# Altium footprint library SparkFun.PCBLIB: 674 footprints (part 36 of 44)
Each footprint in its own frame and in the unit in brackets; x right, y up, seen from the top. Pads: shape width x height; smd on the part's side, far side on the other; paste and mask are expansions set on the pad; w line width, h text height; cw(c..) or ccw(c..) is an arc to the next point about the centre after c.
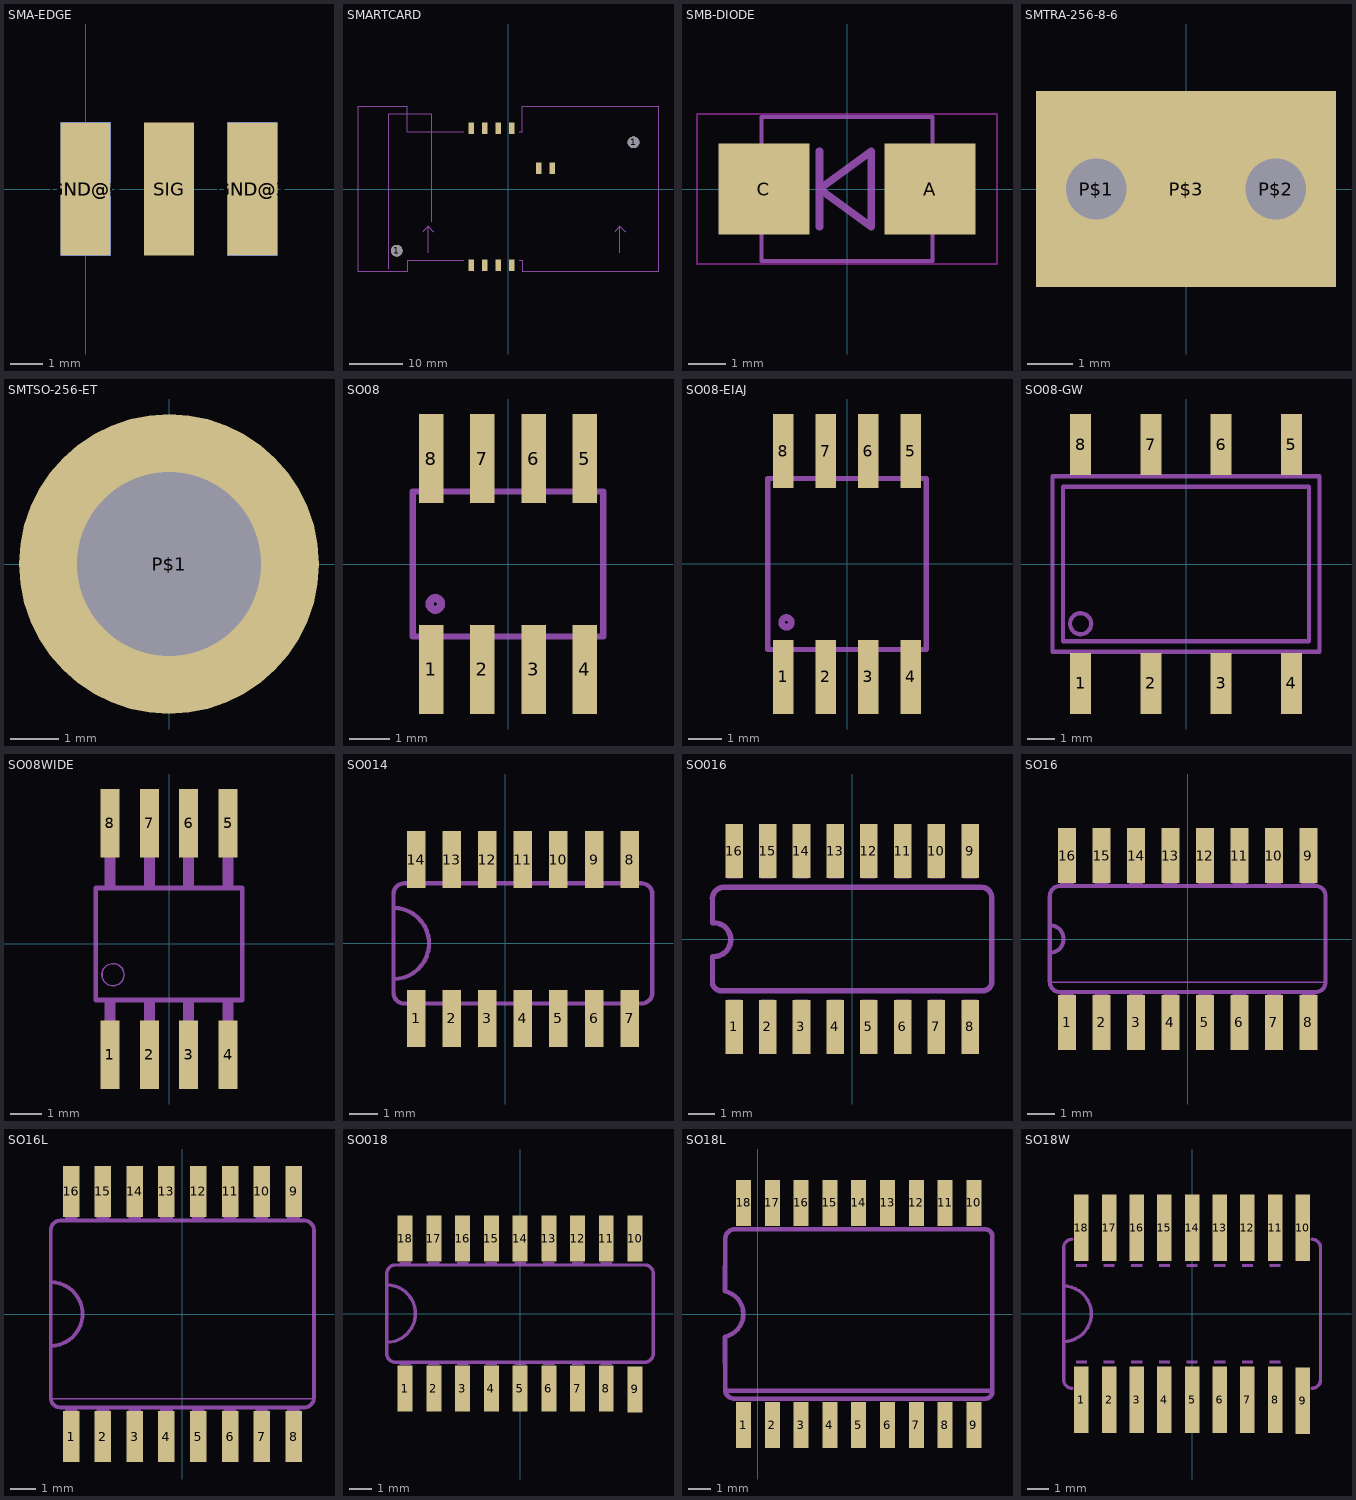
[diagram p35: the footprints below, top view; thin cyan lines are the x and y axes]

## SMA-EDGE [mil]
pads (5):
  rect 60x160 smd paste-80: GND@0(0,0) GND@1(200,0) SIG(100,0)
  rect 60x160 smd far side: GND@2(0,0) GND@3(200,0)

## SMARTCARD [mm]
pads (12):
  round 2.2 hole 2.2: 1(-20.89,-11.57) 1(23.56,8.75)
  rect 1x2.1 smd: C1(-6.92,11.4) C2(-4.38,11.4) C3(-1.84,11.4) C4(0.7,11.4) C5(-6.92,-14.3) C6(-4.38,-14.3) C7(-1.84,-14.3) C8(0.7,-14.3) P1(5.78,3.91) P2(8.32,3.91)
Mechanical 2:
  lines w0.203: -8.29,-13.35 -18.89,-13.35 -18.89,-15.55 -28.15,-15.55 -28.15,15.55 -18.89,15.55 -18.89,10.7 -8.29,10.7 ; 2.11,-13.35 2.71,-13.35 2.71,-15.55 28.15,-15.55 28.15,15.55 2.71,15.55 2.71,10.7 2.11,10.7
Mechanical 18:
  lines w0.127: -22.5,-15 -22.5,14 -14.3,14 -14.3,-6.11
  lines w0.203: -16,-8 -15,-7 ; -15,-12 -15,-7 ; -14,-8 -15,-7 ; 20,-8 21,-7 ; 21,-12 21,-7 ; 22,-8 21,-7

## SMB-DIODE [mil]
pads (2):
  rect 94.49x94.49 smd: A(86.61,0) C(-86.61,0)
Keep-Out Layer:
  lines w2: -156.42,-78.07 156.42,-78.07 156.42,78.07 -156.42,78.07 -156.42,-78.07
Mechanical 2:
  lines w4: -89,-75 89,-75 ; -89,75 89,75
  lines w8: -28.74,-39.37 -28.74,39.37 ; -28.74,0 25.32,39.37 25.32,-39.37 -28.74,0
Mechanical 18:
  rectangle: -110,-43 -89,43
  rectangle: 89,-43 110,43
  lines w4: -89.02,-75 -89.02,75 ; 89.02,-75 89.02,75

## SMTRA-256-8-6 [mil]
pads (3):
  round 79.5 hole 53: P$1(-78.5,0) P$2(78.5,0)
  rect 262x171 smd paste-131: P$3(0,0)
Top Paste:
  rectangle: -130,30 130,80
  rectangle: -40,20 40,30
  rectangle: -40,-40 40,-30
  rectangle: -130,-80 130,-30
  rectangle: -40,-30 40,-20
  rectangle: 110,20 130,30
  rectangle: 110,-30 130,-20
  rectangle: -130,-30 -110,-20
  rectangle: -130,20 -110,30

## SMTSO-256-ET [mil]
pads (1):
  round 244 hole 150: P$1(0,0)
Top Paste:
  lines w40: -90,-40 ccw(c0,0) -40,-90 ; -90,40 cw(c0,0) -40,90 ; 40,-90 ccw(c0,0) 90,-40 ; 40,90 cw(c0,0) 90,40
Mechanical 18:
  circle w5: c0,0 r40

## SO08 [mil]
pads (8):
  rect 24x87 smd: 1(-75,-103) 2(-25,-103) 3(25,-103) 4(75,-103) 5(75,103) 6(25,103) 7(-25,103) 8(-75,103)
Mechanical 2:
  circle w8: c-71,-39 r5.65
  lines w6: -92.99,-70.98 -92.99,70.98 ; 92.99,-70.98 92.99,70.98
Mechanical 18:
  rectangle: -82,-113 -68,-73
  rectangle: -32,-113 -18,-73
  rectangle: 18,-113 32,-73
  rectangle: 68,-113 82,-73
  rectangle: -82,73 -68,113
  rectangle: -32,73 -18,113
  rectangle: 18,73 32,113
  rectangle: 68,73 82,113
  lines w6: -92.99,-70.98 92.99,-70.98 ; -92.99,70.98 92.99,70.98

## SO08-EIAJ [mil]
pads (8):
  rect 24x87 smd: 1(-75,-133) 2(-25,-133) 3(25,-133) 4(75,-133) 5(75,132) 6(25,132) 7(-25,132) 8(-75,132)
Mechanical 2:
  circle w8: c-71,-69 r5.65
  lines w6: -92.99,-100.98 -92.99,99.98 ; 92.99,-100.98 92.99,99.98
Mechanical 18:
  rectangle: -82,-143 -68,-103
  rectangle: -32,-143 -18,-103
  rectangle: 18,-143 32,-103
  rectangle: 68,-143 82,-103
  rectangle: -82,102 -68,142
  rectangle: -32,102 -18,142
  rectangle: 18,102 32,142
  rectangle: 68,102 82,142
  lines w6: -92.99,-100.98 92.99,-100.98 ; -92.99,99.98 92.99,99.98

## SO08-GW [mil]
pads (8):
  rect 30x87 smd: 1(-150,-170) 2(-50,-170) 3(50,-170) 4(150,-170) 5(150,170) 6(50,170) 7(-50,170) 8(-150,170)
Mechanical 2:
  circle w6: c-150,-85 r15
  lines w6: -170,-125 -190,-125 -190,125 -170,125 ; -130,-125 -70,-125 ; -130,125 -70,125 ; -30,-125 30,-125 ; -30,125 30,125 ; 70,-125 130,-125 ; 70,125 130,125 ; 170,-125 190,-125 190,125 170,125 ; -175,-110 175,-110 175,110 -175,110 -175,-110
Mechanical 18:
  rectangle: -160,-190 -140,-125
  rectangle: -60,-190 -40,-125
  rectangle: 40,-190 60,-125
  rectangle: 140,-190 160,-125
  rectangle: -160,125 -140,190
  rectangle: -60,125 -40,190
  rectangle: 40,125 60,190
  rectangle: 140,125 160,190
  lines w6: -170,-125 -130,-125 ; -170,125 -130,125 ; -70,-125 -30,-125 ; -70,125 -30,125 ; 30,-125 70,-125 ; 30,125 70,125 ; 130,-125 170,-125 ; 130,125 170,125

## SO08WIDE [mil]
pads (8):
  rect 24x87 smd: 1(-75,-140.5) 2(-25,-140.5) 3(25,-140.5) 4(75,-140.5) 5(75,153) 6(25,153) 7(-25,153) 8(-75,153)
Mechanical 2:
  circle w2: c-71,-39 r14
  lines w6: -92.99,-70.98 -92.99,70.98 ; 92.99,-70.98 92.99,70.98
Mechanical 18:
  rectangle: -82,-113 -68,-73
  rectangle: -32,-113 -18,-73
  rectangle: 18,-113 32,-73
  rectangle: 68,-113 82,-73
  rectangle: -82,73 -68,113
  rectangle: -32,73 -18,113
  rectangle: 18,73 32,113
  rectangle: 68,73 82,113
  lines w6: -92.99,-70.98 92.99,-70.98 ; -92.99,70.98 92.99,70.98

## SO014 [mil]
pads (14):
  rect 26x80 smd: 1(-125,-105.5) 2(-75,-105.5) 3(-25,-105.5) 4(25,-105.5) 5(75,-105.5) 6(125,-105.5) 7(175,-105.5) 8(175,118) 9(125,118) 10(75,118) 11(25,118) 12(-25,118) 13(-75,118) 14(-125,118)
Mechanical 2:
  rectangle: -135,-89.5 -115,-84.5
  rectangle: -135,-89.5 -115,-84.5
  rectangle: -85,-89.5 -65,-84.5
  rectangle: -35,-89.5 -15,-84.5
  rectangle: 15,-89.5 35,-84.5
  rectangle: 65,-89.5 85,-84.5
  rectangle: 115,-89.5 135,-84.5
  rectangle: 165,-89.5 185,-84.5
  rectangle: -135,84.5 -115,89.5
  rectangle: -135,84.5 -115,89.5
  rectangle: -85,84.5 -65,89.5
  rectangle: -35,84.5 -15,89.5
  rectangle: 15,84.5 35,89.5
  rectangle: 65,84.5 85,89.5
  rectangle: 115,84.5 135,89.5
  rectangle: 165,84.5 185,89.5
  lines w6: -157,-50 -157,50 ; -157,-50 -157,-69.5 ccw(c-142,-69.5) -142,-84.5 192,-84.5 ccw(c192,-69.5) 207,-69.5 207,69.5 ccw(c192,69.5) 192,84.5 -142,84.5 ccw(c-142,69.5) -157,69.5 -157,50 ; -157,-50 ccw(c-157,0) -157,50
Mechanical 18:
  rectangle: -135,-135 -115,-77
  rectangle: -85,-135 -65,-77
  rectangle: -35,-135 -15,-77
  rectangle: 15,-135 35,-77
  rectangle: 65,-135 85,-77
  rectangle: 115,-135 135,-77
  rectangle: 165,-135 185,-77
  rectangle: -135,89.5 -115,147.5
  rectangle: -85,89.5 -65,147.5
  rectangle: -35,89.5 -15,147.5
  rectangle: 15,89.5 35,147.5
  rectangle: 65,89.5 85,147.5
  rectangle: 115,89.5 135,147.5
  rectangle: 165,89.5 185,147.5

## SO016 [mil]
pads (16):
  rect 26x80 smd: 1(-175,-130.5) 2(-125,-130.5) 3(-75,-130.5) 4(-25,-130.5) 5(25,-130.5) 6(75,-130.5) 7(125,-130.5) 8(175,-130.5) 9(175,130.5) 10(125,130.5) 11(75,130.5) 12(25,130.5) 13(-25,130.5) 14(-75,130.5) 15(-125,130.5) 16(-175,130.5)
Mechanical 2:
  lines w8: -207,-26 -207,-65.56 ccw(c-193.97,-63.6) -192,-76.63 195.94,-76.63 ccw(c193.97,-63.6) 207,-61.63 207,61.63 ccw(c192,61.63) 192,76.63 -192,76.63 ccw(c-190.03,59.66) -207,57.69 ; -207,24 -207,57.19 ; -205,-26 ccw(c-205,-1) -205,24
Mechanical 18:
  rectangle: -185,-147.5 -165,-89.5
  rectangle: -135,-147.5 -115,-89.5
  rectangle: -85,-147.5 -65,-89.5
  rectangle: -35,-147.5 -15,-89.5
  rectangle: 15,-147.5 35,-89.5
  rectangle: 65,-147.5 85,-89.5
  rectangle: 115,-147.5 135,-89.5
  rectangle: 165,-147.5 185,-89.5
  rectangle: -185,89.5 -165,147.5
  rectangle: -135,89.5 -115,147.5
  rectangle: -85,89.5 -65,147.5
  rectangle: -35,89.5 -15,147.5
  rectangle: 15,89.5 35,147.5
  rectangle: 65,89.5 85,147.5
  rectangle: 115,89.5 135,147.5
  rectangle: 165,89.5 185,147.5

## SO16 [mil]
pads (16):
  rect 26x80 smd: 1(-175,-121) 2(-125,-121) 3(-75,-121) 4(-25,-121) 5(25,-121) 6(75,-121) 7(125,-121) 8(175,-121) 9(175,121) 10(125,121) 11(75,121) 12(25,121) 13(-25,121) 14(-75,121) 15(-125,121) 16(-175,121)
Mechanical 2:
  lines w2: -200,-63 200,-63
  lines w6: -200,-20 ccw(c-200,0) -200,20 ; -200,-62 ccw(c-185,-62) -185,-77 185,-77 ccw(c185,-62) 200,-62 200,62 ccw(c185,62) 185,77 -185,77 ccw(c-185,62) -200,62 -200,-62
Mechanical 18:
  rectangle: -35,77 -15,122
  rectangle: -185,-122 -165,-77
  rectangle: -135,-122 -115,-77
  rectangle: -85,-121 -65,-76
  rectangle: -35,-122 -15,-77
  rectangle: -85,77 -65,122
  rectangle: -135,77 -115,122
  rectangle: -185,77 -165,122
  rectangle: 15,-122 35,-77
  rectangle: 65,-122 85,-77
  rectangle: 115,-122 135,-77
  rectangle: 165,-122 185,-77
  rectangle: 15,77 35,122
  rectangle: 65,77 85,122
  rectangle: 115,77 135,122
  rectangle: 165,77 185,122

## SO16L [mil]
pads (16):
  rect 26x80 smd: 1(-175,-193) 2(-125,-193) 3(-75,-193) 4(-25,-193) 5(25,-193) 6(75,-193) 7(125,-193) 8(175,-193) 9(175,193) 10(125,193) 11(75,193) 12(25,193) 13(-25,193) 14(-75,193) 15(-125,193) 16(-175,193)
Mechanical 2:
  rectangle: -185,-152 -165,-147
  rectangle: -135,-152 -115,-147
  rectangle: -85,-152 -65,-147
  rectangle: -35,-152 -15,-147
  rectangle: 15,-152 35,-147
  rectangle: 65,-152 85,-147
  rectangle: 115,-152 135,-147
  rectangle: 165,-152 185,-147
  rectangle: -185,147 -165,152
  rectangle: -135,147 -115,152
  rectangle: -85,147 -65,152
  rectangle: -35,147 -15,152
  rectangle: 15,147 35,152
  rectangle: 65,147 85,152
  rectangle: 115,147 135,152
  rectangle: 165,147 185,152
  lines w2: -205,-133 206,-133
  lines w6: -207,-50 ccw(c-207,0) -207,50 ; -207,-132 ccw(c-192,-132) -192,-147 192,-147 ccw(c192,-132) 207,-132 207,132 ccw(c192,132) 192,147 -192,147 ccw(c-192,132) -207,132 -207,-132
Mechanical 18:
  rectangle: -185,-210 -165,-152
  rectangle: -135,-210 -115,-152
  rectangle: -85,-210 -65,-152
  rectangle: -35,-210 -15,-152
  rectangle: 15,-210 35,-152
  rectangle: 65,-210 85,-152
  rectangle: 115,-210 135,-152
  rectangle: 165,-210 185,-152
  rectangle: -185,152 -165,210
  rectangle: -135,152 -115,210
  rectangle: -85,152 -65,210
  rectangle: -35,152 -15,210
  rectangle: 15,152 35,210
  rectangle: 65,152 85,210
  rectangle: 115,152 135,210
  rectangle: 165,152 185,210

## SO018 [mil]
pads (18):
  rect 26x80 smd: 1(-200,-130.5) 2(-150,-130.5) 3(-100,-130.5) 4(-50,-130.5) 5(0,-130.5) 6(50,-130.5) 7(100,-130.5) 8(150,-130.5) 9(200,-132) 10(200,130.5) 11(150,130.5) 12(100,130.5) 13(50,130.5) 14(0,130.5) 15(-50,130.5) 16(-100,130.5) 17(-150,130.5) 18(-200,130.5)
Mechanical 2:
  rectangle: -210,-89.5 -190,-84.5
  rectangle: -160,-89.5 -140,-84.5
  rectangle: -110,-89.5 -90,-84.5
  rectangle: -60,-89.5 -40,-84.5
  rectangle: -10,-89.5 10,-84.5
  rectangle: 40,-89.5 60,-84.5
  rectangle: 90,-89.5 110,-84.5
  rectangle: 140,-89.5 160,-84.5
  rectangle: -210,84.5 -190,89.5
  rectangle: -160,84.5 -140,89.5
  rectangle: -110,84.5 -90,89.5
  rectangle: -60,84.5 -40,89.5
  rectangle: -10,84.5 10,89.5
  rectangle: 40,84.5 60,89.5
  rectangle: 90,84.5 110,89.5
  rectangle: 140,84.5 160,89.5
  lines w6: -232,-50 ccw(c-232,0) -232,50 ; -232,-69.5 ccw(c-217,-69.5) -217,-84.5 217,-84.5 ccw(c217,-69.5) 232,-69.5 232,69.5 ccw(c217,69.5) 217,84.5 -217,84.5 ccw(c-217,69.5) -232,69.5 -232,-69.5

## SO18L [mil]
pads (18):
  rect 26x80 smd: 1(-25,-193) 2(25,-193) 3(75,-193) 4(125,-193) 5(175,-193) 6(225,-193) 7(275,-193) 8(325,-193) 9(375,-193) 10(375,193) 11(325,193) 12(275,193) 13(225,193) 14(175,193) 15(125,193) 16(75,193) 17(25,193) 18(-25,193)
Mechanical 2:
  lines w8: -52.24,-133 404,-133 ; -57.09,-39.37 -57,-132 ccw(c-41,-131) -40,-147 394,-147 ccw(c394.51,-134.51) 407,-135 407,135 ccw(c394.51,134.51) 394,147 -40,147 ccw(c-40,130) -57,130 -57.09,39.37 cw(c-65.48,0) -57.09,-39.37

## SO18W [mil]
pads (18):
  rect 26x120 smd: 1(-200,-155.5) 2(-150,-155.5) 3(-100,-155.5) 4(-50,-155.5) 5(0,-155.5) 6(50,-155.5) 7(100,-155.5) 8(150,-155.5) 9(200,-157) 10(200,155.5) 11(150,155.5) 12(100,155.5) 13(50,155.5) 14(0,155.5) 15(-50,155.5) 16(-100,155.5) 17(-150,155.5) 18(-200,155.5)
Mechanical 2:
  rectangle: -210,-89.5 -190,-84.5
  rectangle: -160,-89.5 -140,-84.5
  rectangle: -110,-89.5 -90,-84.5
  rectangle: -60,-89.5 -40,-84.5
  rectangle: -10,-89.5 10,-84.5
  rectangle: 40,-89.5 60,-84.5
  rectangle: 90,-89.5 110,-84.5
  rectangle: 140,-89.5 160,-84.5
  rectangle: -210,84.5 -190,89.5
  rectangle: -160,84.5 -140,89.5
  rectangle: -110,84.5 -90,89.5
  rectangle: -60,84.5 -40,89.5
  rectangle: -10,84.5 10,89.5
  rectangle: 40,84.5 60,89.5
  rectangle: 90,84.5 110,89.5
  rectangle: 140,84.5 160,89.5
  lines w6: -232,-50 ccw(c-232,0) -232,50 ; -217,-134.5 cw(c-217,-119.5) -232,-119.5 -232,119.5 cw(c-217,119.5) -217,134.5 ; 217,-134.5 ccw(c217,-119.5) 232,-119.5 232,119.5 ccw(c217,119.5) 217,134.5
Mechanical 27:
  lines w0: -217.72,134.65 -217.32,134.65 ; 196.85,216.14 197.64,216.14